# Altium footprint library Reflow3D1411sep.PcbLib: 657 footprints (part 18 of 42)
Each footprint in its own frame and in the unit in brackets; x right, y up, seen from the top. Pads: shape width x height; smd on the part's side, far side on the other; paste and mask are expansions set on the pad; w line width, h text height; cw(c..) or ccw(c..) is an arc to the next point about the centre after c.
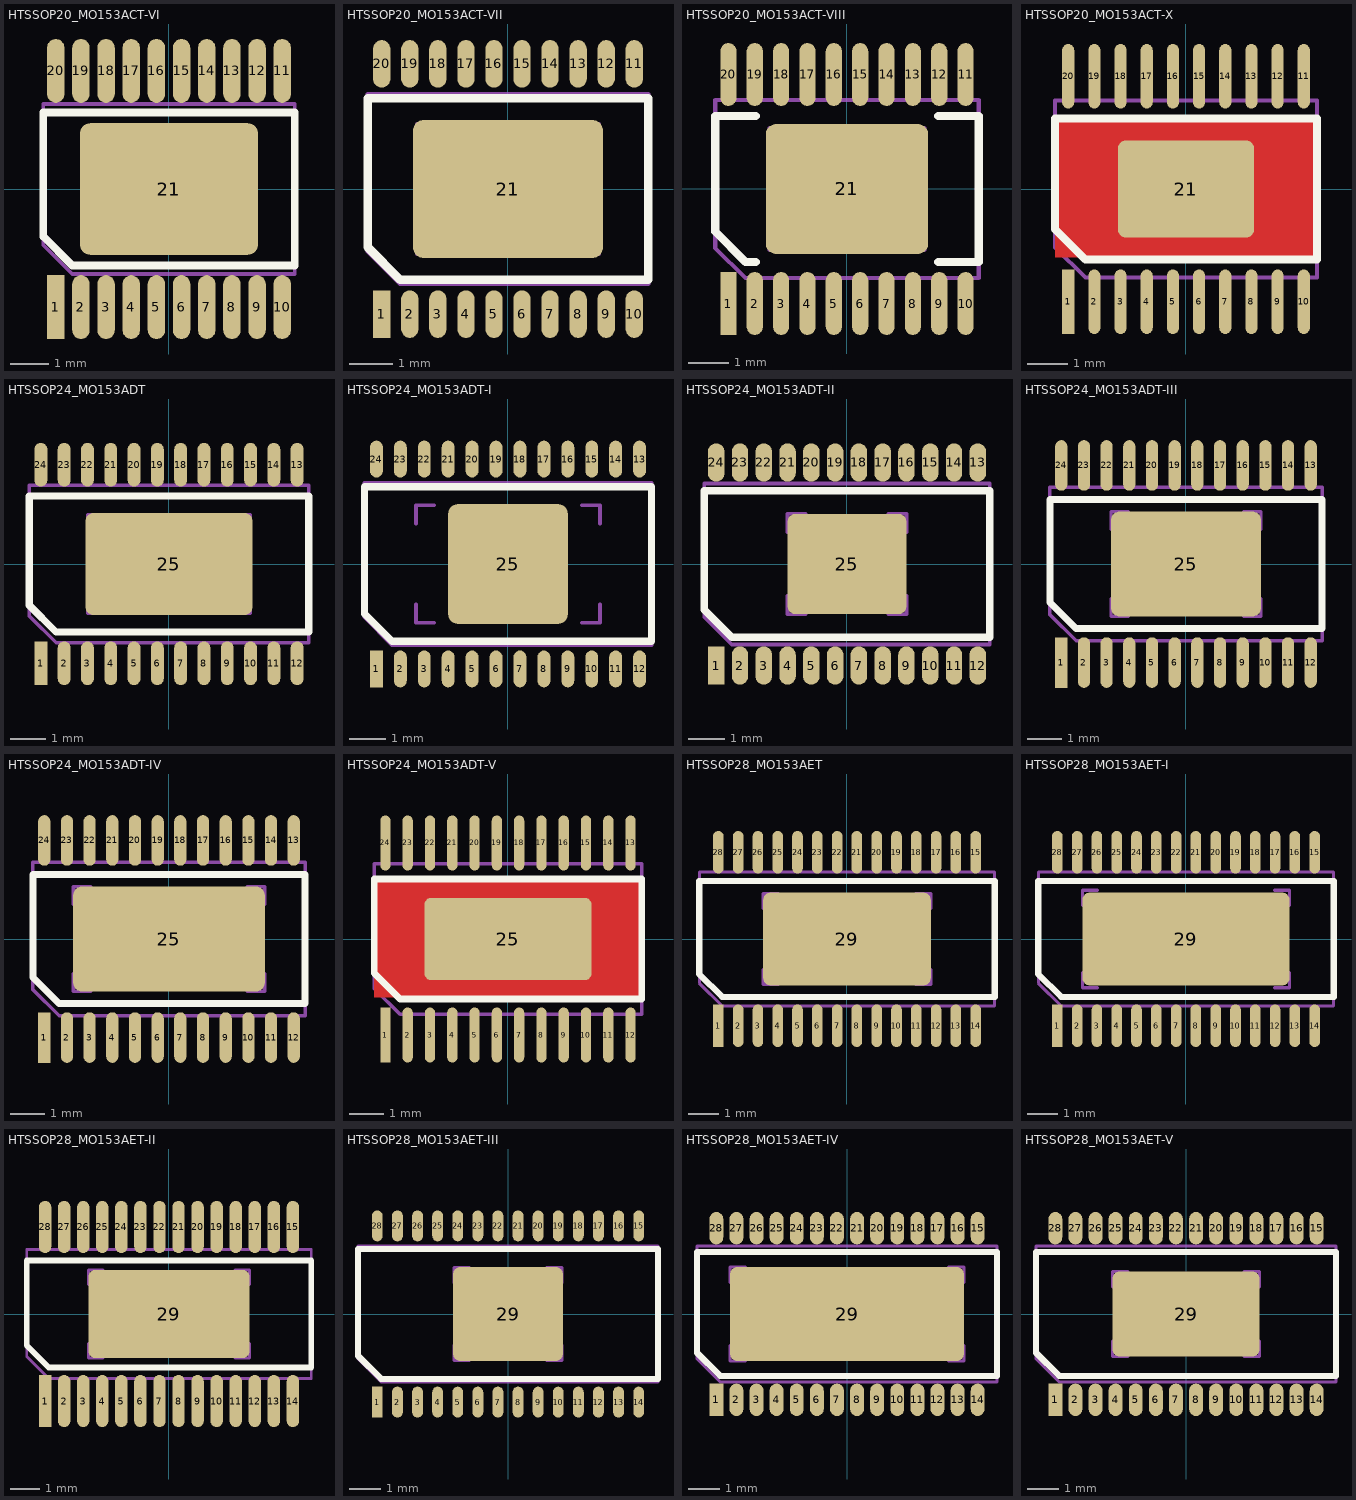
[diagram p17: the footprints below, top view; thin cyan lines are the x and y axes]

## HTSSOP20_MO153ACT-VI [mm] "www.fairchildsemi.com, MTF20A.pdf"
height 1
pads (21):
  rect 0.45x1.65 smd mask+0.05: 1(-2.925,-3.05)
  oval 0.45x1.65 smd mask+0.05: 2(-2.275,-3.05) 3(-1.625,-3.05) 4(-0.975,-3.05) 5(-0.325,-3.05) 6(0.325,-3.05) 7(0.975,-3.05) 8(1.625,-3.05) 9(2.275,-3.05) 10(2.925,-3.05) 11(2.925,3.05) 12(2.275,3.05) 13(1.625,3.05) 14(0.975,3.05) 15(0.325,3.05) 16(-0.325,3.05) 17(-0.975,3.05) 18(-1.625,3.05) 19(-2.275,3.05) 20(-2.925,3.05)
  rrect15% 4.6x3.4 smd mask+0.075: 21(0,0)
Top Overlay:
  lines w0.2: -3.25,-1.225 -3.25,1.975 3.25,1.975 3.25,-1.975 -2.5,-1.975 -3.25,-1.225
Mechanical 13:
  lines w0.1: -2.1,-1 -2.1,-1.5 -1.6,-1.5 ; -2.1,1 -2.1,1.5 -1.6,1.5 ; 1.6,-1.5 2.1,-1.5 2.1,-1 ; 1.6,1.5 2.1,1.5 2.1,1 ; -3.25,-1.45 -3.25,2.2 3.25,2.2 3.25,-2.2 -2.5,-2.2 -3.25,-1.45
Mechanical 15:
  lines w0.1: -0.5,0 0.5,0 ; 0,-0.5 0,0.5
3D body: height 1.2, standoff 0, extent -3.3,-2.25 3.3,2.25

## HTSSOP20_MO153ACT-VII [mm] "www.nxp.com, sot527-1.pdf, SOT527-1_fr.pdf"
height 0.98
pads (21):
  rect 0.4x1.1 smd mask+0.05: 1(-2.925,-2.9)
  oval 0.4x1.1 smd mask+0.05: 2(-2.275,-2.9) 3(-1.625,-2.9) 4(-0.975,-2.9) 5(-0.325,-2.9) 6(0.325,-2.9) 7(0.975,-2.9) 8(1.625,-2.9) 9(2.275,-2.9) 10(2.925,-2.9) 11(2.925,2.9) 12(2.275,2.9) 13(1.625,2.9) 14(0.975,2.9) 15(0.325,2.9) 16(-0.325,2.9) 17(-0.975,2.9) 18(-1.625,2.9) 19(-2.275,2.9) 20(-2.925,2.9)
  rrect15% 4.4x3.2 smd paste-25.4 mask+0.075: 21(0,0)
Top Overlay:
  lines w0.2: -3.25,-1.35 -2.5,-2.1 3.25,-2.1 3.25,2.1 -3.25,2.1 -3.25,-1.35
Top Paste:
  region: -1.45,-0.4 -1.45,0.4 -2.15,0.4 -2.15,-0.4
  region: -1.45,-1.55 -1.45,-0.75 -2.15,-0.75 -2.15,-1.55
  region: -1.45,0.75 -1.45,1.55 -2.15,1.55 -2.15,0.75
  region: 1.45,0.4 1.45,-0.4 2.15,-0.4 2.15,0.4
  region: 1.45,1.55 1.45,0.75 2.15,0.75 2.15,1.55
  region: 1.45,-0.75 1.45,-1.55 2.15,-1.55 2.15,-0.75
  region: 0.25,-0.75 0.25,-1.55 0.95,-1.55 0.95,-0.75
  region: -0.95,-0.75 -0.95,-1.55 -0.25,-1.55 -0.25,-0.75
  region: 0.25,1.55 0.25,0.75 0.95,0.75 0.95,1.55
  region: -0.95,1.55 -0.95,0.75 -0.25,0.75 -0.25,1.55
  region: -0.95,0.4 -0.95,-0.4 -0.25,-0.4 -0.25,0.4
  region: 0.25,0.4 0.25,-0.4 0.95,-0.4 0.95,0.4
Mechanical 13:
  lines w0.1: -2.1,-1 -2.1,-1.5 -1.6,-1.5 ; -2.1,1 -2.1,1.5 -1.6,1.5 ; 1.6,-1.5 2.1,-1.5 2.1,-1 ; 1.6,1.5 2.1,1.5 2.1,1 ; -3.25,-1.45 -3.25,2.2 3.25,2.2 3.25,-2.2 -2.5,-2.2 -3.25,-1.45
Mechanical 15:
  lines w0.1: -0.5,0 0.5,0 ; 0,-0.5 0,0.5
3D body: height 1.1, standoff 0, extent -3.3,-2.25 3.3,2.25

## HTSSOP20_MO153ACT-VIII [mm] "www.semtech.com, sc441a.pdf"
height 1.01
pads (21):
  rect 0.4x1.55 smd mask+0.05: 1(-2.925,-2.825)
  oval 0.4x1.55 smd mask+0.05: 2(-2.275,-2.825) 3(-1.625,-2.825) 4(-0.975,-2.825) 5(-0.325,-2.825) 6(0.325,-2.825) 7(0.975,-2.825) 8(1.625,-2.825) 9(2.275,-2.825) 10(2.925,-2.825) 11(2.925,2.825) 12(2.275,2.825) 13(1.625,2.825) 14(0.975,2.825) 15(0.325,2.825) 16(-0.325,2.825) 17(-0.975,2.825) 18(-1.625,2.825) 19(-2.275,2.825) 20(-2.925,2.825)
  rrect15% 4x3.2 smd mask+0.075: 21(0,0)
Top Overlay:
  lines w0.2: -2.25,-1.8 -2.5,-1.8 -3.25,-1.05 -3.25,1.8 -2.25,1.8 ; 2.25,-1.8 3.25,-1.8 3.25,1.8 2.25,1.8
Mechanical 13:
  lines w0.1: -1.905,-1 -1.905,-1.5 -1.405,-1.5 ; -1.905,1 -1.905,1.5 -1.405,1.5 ; 1.405,-1.5 1.905,-1.5 1.905,-1 ; 1.405,1.5 1.905,1.5 1.905,1 ; -3.25,-1.45 -3.25,2.2 3.25,2.2 3.25,-2.2 -2.5,-2.2 -3.25,-1.45
Mechanical 15:
  lines w0.1: -0.5,0 0.5,0 ; 0,-0.5 0,0.5
3D body: height 1.2, standoff 0, extent -3.3,-2.25 3.3,2.25

## HTSSOP20_MO153ACT-X [mm] "www.ti.com, tps77518-ep.pdf"
height 1.1
pads (21):
  rect 0.3x1.6 smd mask+0.075: 1(-2.925,-2.8)
  oval 0.3x1.6 smd mask+0.075: 2(-2.275,-2.8) 3(-1.625,-2.8) 4(-0.975,-2.8) 5(-0.325,-2.8) 6(0.325,-2.8) 7(0.975,-2.8) 8(1.625,-2.8) 9(2.275,-2.8) 10(2.925,-2.8) 11(2.925,2.8) 12(2.275,2.8) 13(1.625,2.8) 14(0.975,2.8) 15(0.325,2.8) 16(-0.325,2.8) 17(-0.975,2.8) 18(-1.625,2.8) 19(-2.275,2.8) 20(-2.925,2.8)
  rrect15% 3.38x2.4 smd mask+0: 21(0,0)
Top Layer:
  region: -3.25,1.7 3.25,1.7 3.25,-1.7 -3.25,-1.7
Top Overlay:
  lines w0.2: -3.25,-1 -2.5,-1.75 3.25,-1.75 3.25,1.75 -3.25,1.75 -3.25,-1
Mechanical 13:
  lines w0.1: -1.49,-0.5 -1.49,-1 -0.99,-1 ; -1.49,0.5 -1.49,1 -0.99,1 ; 0.99,-1 1.49,-1 1.49,-0.5 ; 0.99,1 1.49,1 1.49,0.5 ; -3.25,-1.45 -3.25,2.2 3.25,2.2 3.25,-2.2 -2.5,-2.2 -3.25,-1.45
Mechanical 15:
  lines w0.1: -0.5,0 0.5,0 ; 0,-0.5 0,0.5
3D body: height 1.2, standoff 0, extent -3.3,-2.25 3.3,2.25

## HTSSOP24_MO153ADT [mm] "www.maxim-ic.com, 21-0108.PDF, 90-0345.PDF"
height 1
pads (25):
  rect 0.36x1.22 smd mask+0.075: 1(-3.575,-2.77)
  oval 0.36x1.22 smd mask+0.075: 2(-2.925,-2.77) 3(-2.275,-2.77) 4(-1.625,-2.77) 5(-0.975,-2.77) 6(-0.325,-2.77) 7(0.325,-2.77) 8(0.975,-2.77) 9(1.625,-2.77) 10(2.275,-2.77) 11(2.925,-2.77) 12(3.575,-2.77) 13(3.575,2.77) 14(2.925,2.77) 15(2.275,2.77) 16(1.625,2.77) 17(0.975,2.77) 18(0.325,2.77) 19(-0.325,2.77) 20(-0.975,2.77) 21(-1.625,2.77) 22(-2.275,2.77) 23(-2.925,2.77) 24(-3.575,2.77)
  rrect15% 4.65x2.85 smd mask+0.075: 25(0,0)
Top Overlay:
  lines w0.2: -3.9,-1.15 -3.15,-1.9 3.9,-1.9 3.9,1.9 -3.9,1.9 -3.9,-1.15
Mechanical 13:
  lines w0.1: -2.27,-0.87 -2.27,-1.37 -1.77,-1.37 ; -2.27,0.87 -2.27,1.37 -1.77,1.37 ; 1.77,-1.37 2.27,-1.37 2.27,-0.87 ; 1.77,1.37 2.27,1.37 2.27,0.87 ; -3.9,-1.45 -3.9,2.2 3.9,2.2 3.9,-2.2 -3.15,-2.2 -3.9,-1.45
Mechanical 15:
  lines w0.1: -0.5,0 0.5,0 ; 0,-0.5 0,0.5
3D body: height 1.1, standoff 0, extent -3.95,-2.25 3.95,2.25

## HTSSOP24_MO153ADT-I [mm] "www.analog.com, RE_24.pdf, RE-24.pdf; www.jedec.org, MO-153f.pdf"
height 1.1
pads (25):
  rect 0.35x1 smd mask+0.075: 1(-3.575,-2.85)
  oval 0.35x1 smd mask+0.075: 2(-2.925,-2.85) 3(-2.275,-2.85) 4(-1.625,-2.85) 5(-0.975,-2.85) 6(-0.325,-2.85) 7(0.325,-2.85) 8(0.975,-2.85) 9(1.625,-2.85) 10(2.275,-2.85) 11(2.925,-2.85) 12(3.575,-2.85) 13(3.575,2.85) 14(2.925,2.85) 15(2.275,2.85) 16(1.625,2.85) 17(0.975,2.85) 18(0.325,2.85) 19(-0.325,2.85) 20(-0.975,2.85) 21(-1.625,2.85) 22(-2.275,2.85) 23(-2.925,2.85) 24(-3.575,2.85)
  rrect15% 3.25x3.25 smd mask+0.075: 25(0,0)
Top Overlay:
  lines w0.2: -3.9,-1.35 -3.9,2.1 3.9,2.1 3.9,-2.1 -3.15,-2.1 -3.9,-1.35
Mechanical 13:
  lines w0.1: -2.5,-1.1 -2.5,-1.6 -2,-1.6 ; -2.5,1.1 -2.5,1.6 -2,1.6 ; 2,-1.6 2.5,-1.6 2.5,-1.1 ; 2,1.6 2.5,1.6 2.5,1.1 ; -3.9,-1.45 -3.15,-2.2 3.9,-2.2 3.9,2.2 -3.9,2.2 -3.9,-1.45
Mechanical 15:
  lines w0.1: -0.5,0 0.5,0 ; 0,-0.5 0,0.5
3D body: height 1.2, standoff 0, extent -3.95,-2.25 3.95,2.25

## HTSSOP24_MO153ADT-II [mm] "www.linear.com, TSSOP_24_05-08-1771.pdf"
height 1.1
pads (25):
  rect 0.45x1.05 smd mask+0.05: 1(-3.575,-2.775)
  oval 0.45x1.05 smd mask+0.05: 2(-2.925,-2.775) 3(-2.275,-2.775) 4(-1.625,-2.775) 5(-0.975,-2.775) 6(-0.325,-2.775) 7(0.325,-2.775) 8(0.975,-2.775) 9(1.625,-2.775) 10(2.275,-2.775) 11(2.925,-2.775) 12(3.575,-2.775) 13(3.575,2.775) 14(2.925,2.775) 15(2.275,2.775) 16(1.625,2.775) 17(0.975,2.775) 18(0.325,2.775) 19(-0.325,2.775) 20(-0.975,2.775) 21(-1.625,2.775) 22(-2.275,2.775) 23(-2.925,2.775) 24(-3.575,2.775)
  rrect15% 3.25x2.74 smd mask+0.075: 25(0,0)
Top Overlay:
  lines w0.2: -3.9,-1.25 -3.9,2 3.9,2 3.9,-2 -3.15,-2 -3.9,-1.25
Mechanical 13:
  lines w0.1: -1.625,-0.87 -1.625,-1.37 -1.125,-1.37 ; -1.625,0.87 -1.625,1.37 -1.125,1.37 ; 1.125,-1.37 1.625,-1.37 1.625,-0.87 ; 1.125,1.37 1.625,1.37 1.625,0.87 ; -3.9,-1.45 -3.9,2.2 3.9,2.2 3.9,-2.2 -3.15,-2.2 -3.9,-1.45
Mechanical 15:
  lines w0.1: -0.5,0 0.5,0 ; 0,-0.5 0,0.5
3D body: height 1.2, standoff 0, extent -3.95,-2.25 3.95,2.25

## HTSSOP24_MO153ADT-III [mm] "www.intersil.com, M24.173C.pdf"
height 0.95
pads (25):
  rect 0.35x1.45 smd mask+0.075: 1(-3.575,-2.825)
  oval 0.35x1.45 smd mask+0.075: 2(-2.925,-2.825) 3(-2.275,-2.825) 4(-1.625,-2.825) 5(-0.975,-2.825) 6(-0.325,-2.825) 7(0.325,-2.825) 8(0.975,-2.825) 9(1.625,-2.825) 10(2.275,-2.825) 11(2.925,-2.825) 12(3.575,-2.825) 13(3.575,2.825) 14(2.925,2.825) 15(2.275,2.825) 16(1.625,2.825) 17(0.975,2.825) 18(0.325,2.825) 19(-0.325,2.825) 20(-0.975,2.825) 21(-1.625,2.825) 22(-2.275,2.825) 23(-2.925,2.825) 24(-3.575,2.825)
  rrect15% 4.3x3 smd mask+0.075: 25(0,0)
Top Overlay:
  lines w0.2: -3.9,-1.1 -3.15,-1.85 3.9,-1.85 3.9,1.85 -3.9,1.85 -3.9,-1.1
Mechanical 13:
  lines w0.1: -2.15,-1 -2.15,-1.5 -1.65,-1.5 ; -2.15,1 -2.15,1.5 -1.65,1.5 ; 1.65,-1.5 2.15,-1.5 2.15,-1 ; 1.65,1.5 2.15,1.5 2.15,1 ; -3.9,-1.45 -3.15,-2.2 3.9,-2.2 3.9,2.2 -3.9,2.2 -3.9,-1.45
Mechanical 15:
  lines w0.1: -0.5,0 0.5,0 ; 0,-0.5 0,0.5
3D body: height 1.2, standoff 0, extent -3.95,-2.25 3.95,2.25

## HTSSOP24_MO153ADT-IV [mm] "www.intersil.com, M24.173D.pdf"
height 0.95
pads (25):
  rect 0.35x1.45 smd mask+0.075: 1(-3.575,-2.825)
  oval 0.35x1.45 smd mask+0.075: 2(-2.925,-2.825) 3(-2.275,-2.825) 4(-1.625,-2.825) 5(-0.975,-2.825) 6(-0.325,-2.825) 7(0.325,-2.825) 8(0.975,-2.825) 9(1.625,-2.825) 10(2.275,-2.825) 11(2.925,-2.825) 12(3.575,-2.825) 13(3.575,2.825) 14(2.925,2.825) 15(2.275,2.825) 16(1.625,2.825) 17(0.975,2.825) 18(0.325,2.825) 19(-0.325,2.825) 20(-0.975,2.825) 21(-1.625,2.825) 22(-2.275,2.825) 23(-2.925,2.825) 24(-3.575,2.825)
  rrect15% 5.49x3 smd mask+0.075: 25(0,0)
Top Overlay:
  lines w0.2: -3.9,-1.1 -3.15,-1.85 3.9,-1.85 3.9,1.85 -3.9,1.85 -3.9,-1.1
Mechanical 13:
  lines w0.1: -2.745,-1 -2.745,-1.5 -2.245,-1.5 ; -2.745,1 -2.745,1.5 -2.245,1.5 ; 2.245,-1.5 2.745,-1.5 2.745,-1 ; 2.245,1.5 2.745,1.5 2.745,1 ; -3.9,-1.45 -3.15,-2.2 3.9,-2.2 3.9,2.2 -3.9,2.2 -3.9,-1.45
Mechanical 15:
  lines w0.1: -0.5,0 0.5,0 ; 0,-0.5 0,0.5
3D body: height 1.2, standoff 0, extent -3.95,-2.25 3.95,2.25

## HTSSOP24_MO153ADT-V [mm] "www.ti.com, tps65150.pdf"
height 1.1
pads (25):
  rect 0.3x1.6 smd mask+0.075: 1(-3.575,-2.8)
  oval 0.3x1.6 smd mask+0.075: 2(-2.925,-2.8) 3(-2.275,-2.8) 4(-1.625,-2.8) 5(-0.975,-2.8) 6(-0.325,-2.8) 7(0.325,-2.8) 8(0.975,-2.8) 9(1.625,-2.8) 10(2.275,-2.8) 11(2.925,-2.8) 12(3.575,-2.8) 13(3.575,2.8) 14(2.925,2.8) 15(2.275,2.8) 16(1.625,2.8) 17(0.975,2.8) 18(0.325,2.8) 19(-0.325,2.8) 20(-0.975,2.8) 21(-1.625,2.8) 22(-2.275,2.8) 23(-2.925,2.8) 24(-3.575,2.8)
  rrect15% 4.87x2.4 smd mask+0: 25(0,0)
Top Layer:
  region: -3.9,1.7 3.9,1.7 3.9,-1.7 -3.9,-1.7
Top Overlay:
  lines w0.2: -3.9,-1 -3.15,-1.75 3.9,-1.75 3.9,1.75 -3.9,1.75 -3.9,-1
Mechanical 13:
  lines w0.1: -2.21,-0.475 -2.21,-0.975 -1.71,-0.975 ; -2.21,0.475 -2.21,0.975 -1.71,0.975 ; 1.71,-0.975 2.21,-0.975 2.21,-0.475 ; 1.71,0.975 2.21,0.975 2.21,0.475 ; -3.9,-1.45 -3.9,2.2 3.9,2.2 3.9,-2.2 -3.15,-2.2 -3.9,-1.45
Mechanical 15:
  lines w0.1: -0.5,0 0.5,0 ; 0,-0.5 0,0.5
3D body: height 1.2, standoff 0, extent -3.95,-2.25 3.95,2.25

## HTSSOP28_MO153AET [mm] "www.maxim-ic.com, 21-0108.PDF, 90-0146.PDF"
height 1
pads (29):
  rect 0.35x1.4 smd mask+0.075: 1(-4.225,-2.85)
  oval 0.35x1.4 smd mask+0.075: 2(-3.575,-2.85) 3(-2.925,-2.85) 4(-2.275,-2.85) 5(-1.625,-2.85) 6(-0.975,-2.85) 7(-0.325,-2.85) 8(0.325,-2.85) 9(0.975,-2.85) 10(1.625,-2.85) 11(2.275,-2.85) 12(2.925,-2.85) 13(3.575,-2.85) 14(4.225,-2.85) 15(4.225,2.85) 16(3.575,2.85) 17(2.925,2.85) 18(2.275,2.85) 19(1.625,2.85) 20(0.975,2.85) 21(0.325,2.85) 22(-0.325,2.85) 23(-0.975,2.85) 24(-1.625,2.85) 25(-2.275,2.85) 26(-2.925,2.85) 27(-3.575,2.85) 28(-4.225,2.85)
  rrect15% 5.5x3.05 smd mask+0.075: 29(0,0)
Top Overlay:
  lines w0.2: -4.85,-1.15 -4.1,-1.9 4.85,-1.9 4.85,1.9 -4.85,1.9 -4.85,-1.15
Mechanical 13:
  lines w0.1: -2.75,-1 -2.75,-1.5 -2.25,-1.5 ; -2.75,1 -2.75,1.5 -2.25,1.5 ; 2.25,-1.5 2.75,-1.5 2.75,-1 ; 2.25,1.5 2.75,1.5 2.75,1 ; -4.85,-1.45 -4.85,2.2 4.85,2.2 4.85,-2.2 -4.1,-2.2 -4.85,-1.45
Mechanical 15:
  lines w0.1: -0.5,0 0.5,0 ; 0,-0.5 0,0.5
3D body: height 1.1, standoff 0, extent -4.9,-2.25 4.9,2.25

## HTSSOP28_MO153AET-I [mm] "www.maxim-ic.com, 21-0108.PDF, 90-0147.PDF"
height 1
pads (29):
  rect 0.35x1.4 smd mask+0.075: 1(-4.225,-2.85)
  oval 0.35x1.4 smd mask+0.075: 2(-3.575,-2.85) 3(-2.925,-2.85) 4(-2.275,-2.85) 5(-1.625,-2.85) 6(-0.975,-2.85) 7(-0.325,-2.85) 8(0.325,-2.85) 9(0.975,-2.85) 10(1.625,-2.85) 11(2.275,-2.85) 12(2.925,-2.85) 13(3.575,-2.85) 14(4.225,-2.85) 15(4.225,2.85) 16(3.575,2.85) 17(2.925,2.85) 18(2.275,2.85) 19(1.625,2.85) 20(0.975,2.85) 21(0.325,2.85) 22(-0.325,2.85) 23(-0.975,2.85) 24(-1.625,2.85) 25(-2.275,2.85) 26(-2.925,2.85) 27(-3.575,2.85) 28(-4.225,2.85)
  rrect15% 6.8x3.05 smd mask+0.075: 29(0,0)
Top Overlay:
  lines w0.2: -4.85,-1.15 -4.1,-1.9 4.85,-1.9 4.85,1.9 -4.85,1.9 -4.85,-1.15
Mechanical 13:
  lines w0.1: -3.4,-1.1 -3.4,-1.6 -2.9,-1.6 ; -3.4,1.1 -3.4,1.6 -2.9,1.6 ; 2.9,-1.6 3.4,-1.6 3.4,-1.1 ; 2.9,1.6 3.4,1.6 3.4,1.1 ; -4.85,-1.45 -4.85,2.2 4.85,2.2 4.85,-2.2 -4.1,-2.2 -4.85,-1.45
Mechanical 15:
  lines w0.1: -0.5,0 0.5,0 ; 0,-0.5 0,0.5
3D body: height 1.1, standoff 0, extent -4.9,-2.25 4.9,2.25

## HTSSOP28_MO153AET-II [mm] "www.national.com, mxa28a.pdf"
height 1
pads (29):
  rect 0.42x1.78 smd mask+0.05: 1(-4.225,-2.97)
  oval 0.42x1.78 smd mask+0.05: 2(-3.575,-2.97) 3(-2.925,-2.97) 4(-2.275,-2.97) 5(-1.625,-2.97) 6(-0.975,-2.97) 7(-0.325,-2.97) 8(0.325,-2.97) 9(0.975,-2.97) 10(1.625,-2.97) 11(2.275,-2.97) 12(2.925,-2.97) 13(3.575,-2.97) 14(4.225,-2.97) 15(4.225,2.97) 16(3.575,2.97) 17(2.925,2.97) 18(2.275,2.97) 19(1.625,2.97) 20(0.975,2.97) 21(0.325,2.97) 22(-0.325,2.97) 23(-0.975,2.97) 24(-1.625,2.97) 25(-2.275,2.97) 26(-2.925,2.97) 27(-3.575,2.97) 28(-4.225,2.97)
  rrect15% 5.5x3 smd mask+0.075: 29(0,0)
Top Overlay:
  lines w0.2: -4.85,-1.075 -4.85,1.825 4.85,1.825 4.85,-1.825 -4.1,-1.825 -4.85,-1.075
Mechanical 13:
  lines w0.1: -2.75,-1 -2.75,-1.5 -2.25,-1.5 ; -2.75,1 -2.75,1.5 -2.25,1.5 ; 2.25,-1.5 2.75,-1.5 2.75,-1 ; 2.25,1.5 2.75,1.5 2.75,1 ; -4.85,-1.45 -4.1,-2.2 4.85,-2.2 4.85,2.2 -4.85,2.2 -4.85,-1.45
Mechanical 15:
  lines w0.1: -0.5,0 0.5,0 ; 0,-0.5 0,0.5
3D body: height 1.1, standoff 0, extent -4.9,-2.25 4.9,2.25

## HTSSOP28_MO153AET-III [mm] "www.analog.com, 37555854052684RE_28_1.pdf, RE-28-1.pdf; www.jedec.org, MO-153f.pdf"
height 1.1
pads (29):
  rect 0.35x1 smd mask+0.075: 1(-4.225,-2.85)
  oval 0.35x1 smd mask+0.075: 2(-3.575,-2.85) 3(-2.925,-2.85) 4(-2.275,-2.85) 5(-1.625,-2.85) 6(-0.975,-2.85) 7(-0.325,-2.85) 8(0.325,-2.85) 9(0.975,-2.85) 10(1.625,-2.85) 11(2.275,-2.85) 12(2.925,-2.85) 13(3.575,-2.85) 14(4.225,-2.85) 15(4.225,2.85) 16(3.575,2.85) 17(2.925,2.85) 18(2.275,2.85) 19(1.625,2.85) 20(0.975,2.85) 21(0.325,2.85) 22(-0.325,2.85) 23(-0.975,2.85) 24(-1.625,2.85) 25(-2.275,2.85) 26(-2.925,2.85) 27(-3.575,2.85) 28(-4.225,2.85)
  rrect15% 3.55x3.05 smd mask+0.075: 29(0,0)
Top Overlay:
  lines w0.2: -4.85,-1.35 -4.1,-2.1 4.85,-2.1 4.85,2.1 -4.85,2.1 -4.85,-1.35
Mechanical 13:
  lines w0.1: -1.75,-1 -1.75,-1.5 -1.25,-1.5 ; -1.75,1 -1.75,1.5 -1.25,1.5 ; 1.25,-1.5 1.75,-1.5 1.75,-1 ; 1.25,1.5 1.75,1.5 1.75,1 ; -4.85,-1.45 -4.85,2.2 4.85,2.2 4.85,-2.2 -4.1,-2.2 -4.85,-1.45
Mechanical 15:
  lines w0.1: -0.5,0 0.5,0 ; 0,-0.5 0,0.5
3D body: height 1.2, standoff 0, extent -4.9,-2.25 4.9,2.25

## HTSSOP28_MO153AET-IV [mm] "www.linear.com, TSSOP_28_05-08-1663_Variation_EA.pdf"
height 1.1
pads (29):
  rect 0.45x1.05 smd mask+0.05: 1(-4.225,-2.775)
  oval 0.45x1.05 smd mask+0.05: 2(-3.575,-2.775) 3(-2.925,-2.775) 4(-2.275,-2.775) 5(-1.625,-2.775) 6(-0.975,-2.775) 7(-0.325,-2.775) 8(0.325,-2.775) 9(0.975,-2.775) 10(1.625,-2.775) 11(2.275,-2.775) 12(2.925,-2.775) 13(3.575,-2.775) 14(4.225,-2.775) 15(4.225,2.775) 16(3.575,2.775) 17(2.925,2.775) 18(2.275,2.775) 19(1.625,2.775) 20(0.975,2.775) 21(0.325,2.775) 22(-0.325,2.775) 23(-0.975,2.775) 24(-1.625,2.775) 25(-2.275,2.775) 26(-2.925,2.775) 27(-3.575,2.775) 28(-4.225,2.775)
  rrect15% 7.56x3.05 smd mask+0.075: 29(0,0)
Top Overlay:
  lines w0.2: -4.85,-1.25 -4.1,-2 4.85,-2 4.85,2 -4.85,2 -4.85,-1.25
Mechanical 13:
  lines w0.1: -3.78,-1.025 -3.78,-1.525 -3.28,-1.525 ; -3.78,1.025 -3.78,1.525 -3.28,1.525 ; 3.28,-1.525 3.78,-1.525 3.78,-1.025 ; 3.28,1.525 3.78,1.525 3.78,1.025 ; -4.85,-1.45 -4.1,-2.2 4.85,-2.2 4.85,2.2 -4.85,2.2 -4.85,-1.45
Mechanical 15:
  lines w0.1: -0.5,0 0.5,0 ; 0,-0.5 0,0.5
3D body: height 1.2, standoff 0, extent -4.9,-2.25 4.9,2.25

## HTSSOP28_MO153AET-V [mm] "www.linear.com, TSSOP_28_05-08-1663_Variation_EB.pdf"
height 1.1
pads (29):
  rect 0.45x1.05 smd mask+0.05: 1(-4.225,-2.775)
  oval 0.45x1.05 smd mask+0.05: 2(-3.575,-2.775) 3(-2.925,-2.775) 4(-2.275,-2.775) 5(-1.625,-2.775) 6(-0.975,-2.775) 7(-0.325,-2.775) 8(0.325,-2.775) 9(0.975,-2.775) 10(1.625,-2.775) 11(2.275,-2.775) 12(2.925,-2.775) 13(3.575,-2.775) 14(4.225,-2.775) 15(4.225,2.775) 16(3.575,2.775) 17(2.925,2.775) 18(2.275,2.775) 19(1.625,2.775) 20(0.975,2.775) 21(0.325,2.775) 22(-0.325,2.775) 23(-0.975,2.775) 24(-1.625,2.775) 25(-2.275,2.775) 26(-2.925,2.775) 27(-3.575,2.775) 28(-4.225,2.775)
  rrect15% 4.75x2.74 smd mask+0.075: 29(0,0)
Top Overlay:
  lines w0.2: -4.85,-1.25 -4.85,2 4.85,2 4.85,-2 -4.1,-2 -4.85,-1.25
Mechanical 13:
  lines w0.1: -2.375,-0.87 -2.375,-1.37 -1.875,-1.37 ; -2.375,0.87 -2.375,1.37 -1.875,1.37 ; 1.875,-1.37 2.375,-1.37 2.375,-0.87 ; 1.875,1.37 2.375,1.37 2.375,0.87 ; -4.85,-1.45 -4.85,2.2 4.85,2.2 4.85,-2.2 -4.1,-2.2 -4.85,-1.45
Mechanical 15:
  lines w0.1: -0.5,0 0.5,0 ; 0,-0.5 0,0.5
3D body: height 1.2, standoff 0, extent -4.9,-2.25 4.9,2.25